# Altium schematic symbol library jlcpcb_2025_04_resistors_extended_2512.schlib: 2667 symbols (part 14 of 14)
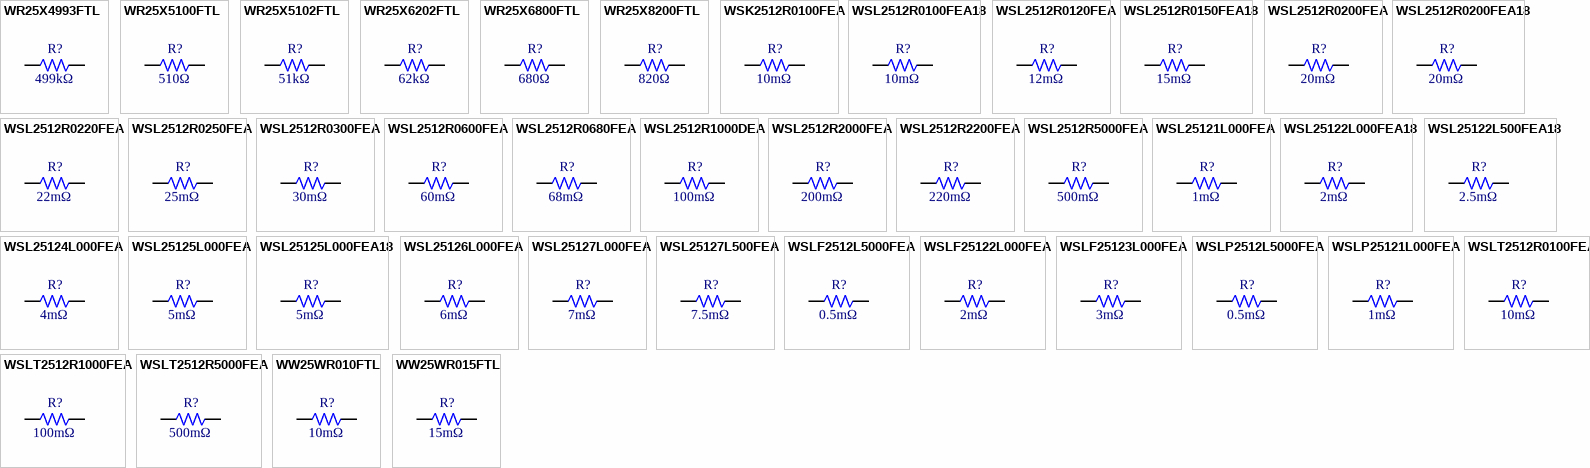
[diagram p79: symbols WR25X4993FTL to WW25WR015FTL]

## WSL2512R0150FEA18
designator R?  Resistance: 15mΩ  (hidden comment: *)
Resistor, 15mΩ, ±1%, 2W, ±75ppm/℃, -65℃~+170℃, SMD 2512; Manufacturer: Uniroyal; Manufacturer Part Number: WSL2512R0150FEA18; Supplier 1: LCSC; Supplier Part Number 1: C844290; JLCPCB Part Number: C844290; Power Rating: 2W; Category: Resistors; Package Size: 2512; JLCPCB Basic Part: Yes; Tolerance: ±1%; Temperature Coefficient: ±75ppm/℃; Temperature Rating: -65℃~+170℃; ComponentLink1Description: Datasheet; ComponentLink1URL: https://wmsc.lcsc.com/wmsc/upload/file/pdf/v2/lcsc/2210190530_Vishay-Intertech-WSL2512R0150FEA18_C844290.pdf; ComponentLink2Description: JLCPCB Part URL; ComponentLink2URL: https://jlcpcb.com/partdetail/C844290
pins: 1, 2
1 alternate drawing of the same symbol

## WSL2512R0200FEA
designator R?  Resistance: 20mΩ  (hidden comment: *)
Resistor, 20mΩ, ±1%, 1W, ±75ppm/℃, -65℃~+170℃, SMD 2512; Manufacturer: Uniroyal; Manufacturer Part Number: WSL2512R0200FEA; Supplier 1: LCSC; Supplier Part Number 1: C553969; JLCPCB Part Number: C553969; Power Rating: 1W; Category: Resistors; Package Size: 2512; JLCPCB Basic Part: Yes; Tolerance: ±1%; Temperature Coefficient: ±75ppm/℃; Temperature Rating: -65℃~+170℃; ComponentLink1Description: Datasheet; ComponentLink1URL: https://wmsc.lcsc.com/wmsc/upload/file/pdf/v2/lcsc/2111241030_Vishay-Intertech-WSL2512R0200FEA_C553969.pdf; ComponentLink2Description: JLCPCB Part URL; ComponentLink2URL: https://jlcpcb.com/partdetail/C553969
pins: 1, 2
1 alternate drawing of the same symbol

## WSL2512R0200FEA18
designator R?  Resistance: 20mΩ  (hidden comment: *)
Resistor, 20mΩ, ±1%, 2W, ±75ppm/℃, -65℃~+170℃, SMD 2512; Manufacturer: Uniroyal; Manufacturer Part Number: WSL2512R0200FEA18; Supplier 1: LCSC; Supplier Part Number 1: C844696; JLCPCB Part Number: C844696; Power Rating: 2W; Category: Resistors; Package Size: 2512; JLCPCB Basic Part: Yes; Tolerance: ±1%; Temperature Coefficient: ±75ppm/℃; Temperature Rating: -65℃~+170℃; ComponentLink1Description: Datasheet; ComponentLink1URL: https://wmsc.lcsc.com/wmsc/upload/file/pdf/v2/lcsc/2312131902_Vishay-Intertech-WSL2512R0200FEA18_C844696.pdf; ComponentLink2Description: JLCPCB Part URL; ComponentLink2URL: https://jlcpcb.com/partdetail/C844696
pins: 1, 2
1 alternate drawing of the same symbol

## WSL2512R0220FEA
designator R?  Resistance: 22mΩ  (hidden comment: *)
Resistor, 22mΩ, ±1%, 1W, ±75ppm/℃, -65℃~+170℃, SMD 2512; Manufacturer: Uniroyal; Manufacturer Part Number: WSL2512R0220FEA; Supplier 1: LCSC; Supplier Part Number 1: C844081; JLCPCB Part Number: C844081; Power Rating: 1W; Category: Resistors; Package Size: 2512; JLCPCB Basic Part: Yes; Tolerance: ±1%; Temperature Coefficient: ±75ppm/℃; Temperature Rating: -65℃~+170℃; ComponentLink1Description: Datasheet; ComponentLink1URL: https://wmsc.lcsc.com/wmsc/upload/file/pdf/v2/lcsc/2206282015_Vishay-Intertech-WSL2512R0220FEA_C844081.pdf; ComponentLink2Description: JLCPCB Part URL; ComponentLink2URL: https://jlcpcb.com/partdetail/C844081
pins: 1, 2
1 alternate drawing of the same symbol

## WSL2512R0250FEA
designator R?  Resistance: 25mΩ  (hidden comment: *)
Resistor, 25mΩ, ±1%, 1W, ±75ppm/℃, -65℃~+170℃, SMD 2512; Manufacturer: Uniroyal; Manufacturer Part Number: WSL2512R0250FEA; Supplier 1: LCSC; Supplier Part Number 1: C844903; JLCPCB Part Number: C844903; Power Rating: 1W; Category: Resistors; Package Size: 2512; JLCPCB Basic Part: Yes; Tolerance: ±1%; Temperature Coefficient: ±75ppm/℃; Temperature Rating: -65℃~+170℃; ComponentLink1Description: Datasheet; ComponentLink1URL: https://wmsc.lcsc.com/wmsc/upload/file/pdf/v2/lcsc/2112021830_Vishay-Intertech-WSL2512R0250FEA_C844903.pdf; ComponentLink2Description: JLCPCB Part URL; ComponentLink2URL: https://jlcpcb.com/partdetail/C844903
pins: 1, 2
1 alternate drawing of the same symbol

## WSL2512R0300FEA
designator R?  Resistance: 30mΩ  (hidden comment: *)
Resistor, 30mΩ, ±1%, 1W, ±75ppm/℃, -65℃~+170℃, SMD 2512; Manufacturer: Uniroyal; Manufacturer Part Number: WSL2512R0300FEA; Supplier 1: LCSC; Supplier Part Number 1: C844697; JLCPCB Part Number: C844697; Power Rating: 1W; Category: Resistors; Package Size: 2512; JLCPCB Basic Part: Yes; Tolerance: ±1%; Temperature Coefficient: ±75ppm/℃; Temperature Rating: -65℃~+170℃; ComponentLink1Description: Datasheet; ComponentLink1URL: https://wmsc.lcsc.com/wmsc/upload/file/pdf/v2/lcsc/2312131902_Vishay-Intertech-WSL2512R0300FEA_C844697.pdf; ComponentLink2Description: JLCPCB Part URL; ComponentLink2URL: https://jlcpcb.com/partdetail/C844697
pins: 1, 2
1 alternate drawing of the same symbol

## WSL2512R0600FEA
designator R?  Resistance: 60mΩ  (hidden comment: *)
Resistor, 60mΩ, ±1%, 1W, ±75ppm/℃, -65℃~+170℃, SMD 2512; Manufacturer: Uniroyal; Manufacturer Part Number: WSL2512R0600FEA; Supplier 1: LCSC; Supplier Part Number 1: C844492; JLCPCB Part Number: C844492; Power Rating: 1W; Category: Resistors; Package Size: 2512; JLCPCB Basic Part: Yes; Tolerance: ±1%; Temperature Coefficient: ±75ppm/℃; Temperature Rating: -65℃~+170℃; ComponentLink1Description: Datasheet; ComponentLink1URL: https://wmsc.lcsc.com/wmsc/upload/file/pdf/v2/lcsc/2206021745_Vishay-Intertech-WSL2512R0600FEA_C844492.pdf; ComponentLink2Description: JLCPCB Part URL; ComponentLink2URL: https://jlcpcb.com/partdetail/C844492
pins: 1, 2
1 alternate drawing of the same symbol

## WSL2512R0680FEA
designator R?  Resistance: 68mΩ  (hidden comment: *)
Resistor, 68mΩ, ±1%, 1W, ±75ppm/℃, -65℃~+170℃, SMD 2512; Manufacturer: Uniroyal; Manufacturer Part Number: WSL2512R0680FEA; Supplier 1: LCSC; Supplier Part Number 1: C4125307; JLCPCB Part Number: C4125307; Power Rating: 1W; Category: Resistors; Package Size: 2512; JLCPCB Basic Part: Yes; Tolerance: ±1%; Temperature Coefficient: ±75ppm/℃; Temperature Rating: -65℃~+170℃; ComponentLink1Description: Datasheet; ComponentLink1URL: https://wmsc.lcsc.com/wmsc/upload/file/pdf/v2/lcsc/2312131019_Vishay-Intertech-WSL2512R0680FEA_C4125307.pdf; ComponentLink2Description: JLCPCB Part URL; ComponentLink2URL: https://jlcpcb.com/partdetail/C4125307
pins: 1, 2
1 alternate drawing of the same symbol

## WSL2512R1000DEA
designator R?  Resistance: 100mΩ  (hidden comment: *)
Resistor, 100mΩ, ±0.5%, 1W, ±75ppm/℃, -65℃~+170℃, SMD 2512; Manufacturer: Uniroyal; Manufacturer Part Number: WSL2512R1000DEA; Supplier 1: LCSC; Supplier Part Number 1: C4322328; JLCPCB Part Number: C4322328; Power Rating: 1W; Category: Resistors; Package Size: 2512; JLCPCB Basic Part: Yes; Tolerance: ±0.5%; Temperature Coefficient: ±75ppm/℃; Temperature Rating: -65℃~+170℃; ComponentLink1Description: Datasheet; ComponentLink1URL: https://wmsc.lcsc.com/wmsc/upload/file/pdf/v2/lcsc/2312181536_Vishay-Intertech-WSL2512R1000DEA_C4322328.pdf; ComponentLink2Description: JLCPCB Part URL; ComponentLink2URL: https://jlcpcb.com/partdetail/C4322328
pins: 1, 2
1 alternate drawing of the same symbol

## WSL2512R2000FEA
designator R?  Resistance: 200mΩ  (hidden comment: *)
Resistor, 200mΩ, ±1%, 1W, ±75ppm/℃, SMD 2512; Manufacturer: Uniroyal; Manufacturer Part Number: WSL2512R2000FEA; Supplier 1: LCSC; Supplier Part Number 1: C844905; JLCPCB Part Number: C844905; Power Rating: 1W; Category: Resistors; Package Size: 2512; JLCPCB Basic Part: Yes; Tolerance: ±1%; Temperature Coefficient: ±75ppm/℃; ComponentLink1Description: Datasheet; ComponentLink1URL: https://wmsc.lcsc.com/wmsc/upload/file/pdf/v2/lcsc/2207211800_Vishay-Intertech-WSL2512R2000FEA_C844905.pdf; ComponentLink2Description: JLCPCB Part URL; ComponentLink2URL: https://jlcpcb.com/partdetail/C844905
pins: 1, 2
1 alternate drawing of the same symbol

## WSL2512R2200FEA
designator R?  Resistance: 220mΩ  (hidden comment: *)
Resistor, 220mΩ, ±1%, 1W, ±75ppm/℃, -65℃~+170℃, SMD 2512; Manufacturer: Uniroyal; Manufacturer Part Number: WSL2512R2200FEA; Supplier 1: LCSC; Supplier Part Number 1: C844292; JLCPCB Part Number: C844292; Power Rating: 1W; Category: Resistors; Package Size: 2512; JLCPCB Basic Part: Yes; Tolerance: ±1%; Temperature Coefficient: ±75ppm/℃; Temperature Rating: -65℃~+170℃; ComponentLink1Description: Datasheet; ComponentLink1URL: https://wmsc.lcsc.com/wmsc/upload/file/pdf/v2/lcsc/2206282015_Vishay-Intertech-WSL2512R2200FEA_C844292.pdf; ComponentLink2Description: JLCPCB Part URL; ComponentLink2URL: https://jlcpcb.com/partdetail/C844292
pins: 1, 2
1 alternate drawing of the same symbol

## WSL2512R5000FEA
designator R?  Resistance: 500mΩ  (hidden comment: *)
Resistor, 500mΩ, ±1%, 1W, ±75ppm/℃, -65℃~+170℃, SMD 2512; Manufacturer: Uniroyal; Manufacturer Part Number: WSL2512R5000FEA; Supplier 1: LCSC; Supplier Part Number 1: C511023; JLCPCB Part Number: C511023; Power Rating: 1W; Category: Resistors; Package Size: 2512; JLCPCB Basic Part: Yes; Tolerance: ±1%; Temperature Coefficient: ±75ppm/℃; Temperature Rating: -65℃~+170℃; ComponentLink1Description: Datasheet; ComponentLink1URL: https://wmsc.lcsc.com/wmsc/upload/file/pdf/v2/lcsc/2009221615_Vishay-Intertech-WSL2512R5000FEA_C511023.pdf; ComponentLink2Description: JLCPCB Part URL; ComponentLink2URL: https://jlcpcb.com/partdetail/C511023
pins: 1, 2
1 alternate drawing of the same symbol

## WSL25121L000FEA
designator R?  Resistance: 1mΩ  (hidden comment: *)
Resistor, 1mΩ, ±1%, 1W, ±275ppm/℃, -65℃~+170℃, SMD 2512; Manufacturer: Uniroyal; Manufacturer Part Number: WSL25121L000FEA; Supplier 1: LCSC; Supplier Part Number 1: C844690; JLCPCB Part Number: C844690; Power Rating: 1W; Category: Resistors; Package Size: 2512; JLCPCB Basic Part: Yes; Tolerance: ±1%; Temperature Coefficient: ±275ppm/℃; Temperature Rating: -65℃~+170℃; ComponentLink1Description: Datasheet; ComponentLink1URL: https://wmsc.lcsc.com/wmsc/upload/file/pdf/v2/lcsc/2312131902_Vishay-Intertech-WSL25121L000FEA_C844690.pdf; ComponentLink2Description: JLCPCB Part URL; ComponentLink2URL: https://jlcpcb.com/partdetail/C844690
pins: 1, 2
1 alternate drawing of the same symbol

## WSL25122L000FEA18
designator R?  Resistance: 2mΩ  (hidden comment: *)
Resistor, 2mΩ, ±1%, 2W, ±275ppm/℃, -65℃~+170℃, SMD 2512; Manufacturer: Uniroyal; Manufacturer Part Number: WSL25122L000FEA18; Supplier 1: LCSC; Supplier Part Number 1: C844691; JLCPCB Part Number: C844691; Power Rating: 2W; Category: Resistors; Package Size: 2512; JLCPCB Basic Part: Yes; Tolerance: ±1%; Temperature Coefficient: ±275ppm/℃; Temperature Rating: -65℃~+170℃; ComponentLink1Description: Datasheet; ComponentLink1URL: https://wmsc.lcsc.com/wmsc/upload/file/pdf/v2/lcsc/2312131902_Vishay-Intertech-WSL25122L000FEA18_C844691.pdf; ComponentLink2Description: JLCPCB Part URL; ComponentLink2URL: https://jlcpcb.com/partdetail/C844691
pins: 1, 2
1 alternate drawing of the same symbol

## WSL25122L500FEA18
designator R?  Resistance: 2.5mΩ  (hidden comment: *)
Resistor, 2.5mΩ, ±1%, 2W, ±275ppm/℃, -65℃~+170℃, SMD 2512; Manufacturer: Uniroyal; Manufacturer Part Number: WSL25122L500FEA18; Supplier 1: LCSC; Supplier Part Number 1: C4173086; JLCPCB Part Number: C4173086; Power Rating: 2W; Category: Resistors; Package Size: 2512; JLCPCB Basic Part: Yes; Tolerance: ±1%; Temperature Coefficient: ±275ppm/℃; Temperature Rating: -65℃~+170℃; ComponentLink1Description: Datasheet; ComponentLink1URL: https://wmsc.lcsc.com/wmsc/upload/file/pdf/v2/lcsc/2312131041_Vishay-Intertech-WSL25122L500FEA18_C4173086.pdf; ComponentLink2Description: JLCPCB Part URL; ComponentLink2URL: https://jlcpcb.com/partdetail/C4173086
pins: 1, 2
1 alternate drawing of the same symbol

## WSL25124L000FEA
designator R?  Resistance: 4mΩ  (hidden comment: *)
Resistor, 4mΩ, ±1%, 1W, ±150ppm/℃, -65℃~+170℃, SMD 2512; Manufacturer: Uniroyal; Manufacturer Part Number: WSL25124L000FEA; Supplier 1: LCSC; Supplier Part Number 1: C844693; JLCPCB Part Number: C844693; Power Rating: 1W; Category: Resistors; Package Size: 2512; JLCPCB Basic Part: Yes; Tolerance: ±1%; Temperature Coefficient: ±150ppm/℃; Temperature Rating: -65℃~+170℃; ComponentLink1Description: Datasheet; ComponentLink1URL: https://wmsc.lcsc.com/wmsc/upload/file/pdf/v2/lcsc/2201051730_Vishay-Intertech-WSL25124L000FEA_C844693.pdf; ComponentLink2Description: JLCPCB Part URL; ComponentLink2URL: https://jlcpcb.com/partdetail/C844693
pins: 1, 2
1 alternate drawing of the same symbol

## WSL25125L000FEA
designator R?  Resistance: 5mΩ  (hidden comment: *)
Resistor, 5mΩ, ±1%, 1W, ±110ppm/℃, -65℃~+170℃, SMD 2512; Manufacturer: Uniroyal; Manufacturer Part Number: WSL25125L000FEA; Supplier 1: LCSC; Supplier Part Number 1: C844900; JLCPCB Part Number: C844900; Power Rating: 1W; Category: Resistors; Package Size: 2512; JLCPCB Basic Part: Yes; Tolerance: ±1%; Temperature Coefficient: ±110ppm/℃; Temperature Rating: -65℃~+170℃; ComponentLink1Description: Datasheet; ComponentLink1URL: https://wmsc.lcsc.com/wmsc/upload/file/pdf/v2/lcsc/2112021830_Vishay-Intertech-WSL25125L000FEA_C844900.pdf; ComponentLink2Description: JLCPCB Part URL; ComponentLink2URL: https://jlcpcb.com/partdetail/C844900
pins: 1, 2
1 alternate drawing of the same symbol

## WSL25125L000FEA18
designator R?  Resistance: 5mΩ  (hidden comment: *)
Resistor, 5mΩ, ±1%, 2W, ±110ppm/℃, -65℃~+170℃, SMD 2512; Manufacturer: Uniroyal; Manufacturer Part Number: WSL25125L000FEA18; Supplier 1: LCSC; Supplier Part Number 1: C844694; JLCPCB Part Number: C844694; Power Rating: 2W; Category: Resistors; Package Size: 2512; JLCPCB Basic Part: Yes; Tolerance: ±1%; Temperature Coefficient: ±110ppm/℃; Temperature Rating: -65℃~+170℃; ComponentLink1Description: Datasheet; ComponentLink1URL: https://wmsc.lcsc.com/wmsc/upload/file/pdf/v2/lcsc/2312131902_Vishay-Intertech-WSL25125L000FEA18_C844694.pdf; ComponentLink2Description: JLCPCB Part URL; ComponentLink2URL: https://jlcpcb.com/partdetail/C844694
pins: 1, 2
1 alternate drawing of the same symbol

## WSL25126L000FEA
designator R?  Resistance: 6mΩ  (hidden comment: *)
Resistor, 6mΩ, ±1%, 1W, ±110ppm/℃, -65℃~+170℃, SMD 2512; Manufacturer: Uniroyal; Manufacturer Part Number: WSL25126L000FEA; Supplier 1: LCSC; Supplier Part Number 1: C843882; JLCPCB Part Number: C843882; Power Rating: 1W; Category: Resistors; Package Size: 2512; JLCPCB Basic Part: Yes; Tolerance: ±1%; Temperature Coefficient: ±110ppm/℃; Temperature Rating: -65℃~+170℃; ComponentLink1Description: Datasheet; ComponentLink1URL: https://wmsc.lcsc.com/wmsc/upload/file/pdf/v2/lcsc/2201051730_Vishay-Intertech-WSL25126L000FEA_C843882.pdf; ComponentLink2Description: JLCPCB Part URL; ComponentLink2URL: https://jlcpcb.com/partdetail/C843882
pins: 1, 2
1 alternate drawing of the same symbol

## WSL25127L000FEA
designator R?  Resistance: 7mΩ  (hidden comment: *)
Resistor, 7mΩ, ±1%, 1W, ±75ppm/℃, -65℃~+170℃, SMD 2512; Manufacturer: Uniroyal; Manufacturer Part Number: WSL25127L000FEA; Supplier 1: LCSC; Supplier Part Number 1: C511006; JLCPCB Part Number: C511006; Power Rating: 1W; Category: Resistors; Package Size: 2512; JLCPCB Basic Part: Yes; Tolerance: ±1%; Temperature Coefficient: ±75ppm/℃; Temperature Rating: -65℃~+170℃; ComponentLink1Description: Datasheet; ComponentLink1URL: https://wmsc.lcsc.com/wmsc/upload/file/pdf/v2/lcsc/2312131229_Vishay-Intertech-WSL25127L000FEA_C511006.pdf; ComponentLink2Description: JLCPCB Part URL; ComponentLink2URL: https://jlcpcb.com/partdetail/C511006
pins: 1, 2
1 alternate drawing of the same symbol

## WSL25127L500FEA
designator R?  Resistance: 7.5mΩ  (hidden comment: *)
Resistor, 7.5mΩ, ±1%, 1W, ±75ppm/℃, -65℃~+170℃, SMD 2512; Manufacturer: Uniroyal; Manufacturer Part Number: WSL25127L500FEA; Supplier 1: LCSC; Supplier Part Number 1: C4166504; JLCPCB Part Number: C4166504; Power Rating: 1W; Category: Resistors; Package Size: 2512; JLCPCB Basic Part: Yes; Tolerance: ±1%; Temperature Coefficient: ±75ppm/℃; Temperature Rating: -65℃~+170℃; ComponentLink1Description: Datasheet; ComponentLink1URL: https://wmsc.lcsc.com/wmsc/upload/file/pdf/v2/lcsc/2312131038_Vishay-Intertech-WSL25127L500FEA_C4166504.pdf; ComponentLink2Description: JLCPCB Part URL; ComponentLink2URL: https://jlcpcb.com/partdetail/C4166504
pins: 1, 2
1 alternate drawing of the same symbol

## WSLF2512L5000FEA
designator R?  Resistance: 0.5mΩ  (hidden comment: *)
Resistor, 0.5mΩ, ±1%, 6W, ±200ppm/℃, -65℃~+170℃, SMD 2512; Manufacturer: Uniroyal; Manufacturer Part Number: WSLF2512L5000FEA; Supplier 1: LCSC; Supplier Part Number 1: C844703; JLCPCB Part Number: C844703; Power Rating: 6W; Category: Resistors; Package Size: 2512; JLCPCB Basic Part: Yes; Tolerance: ±1%; Temperature Coefficient: ±200ppm/℃; Temperature Rating: -65℃~+170℃; ComponentLink1Description: Datasheet; ComponentLink1URL: https://wmsc.lcsc.com/wmsc/upload/file/pdf/v2/lcsc/2312131902_Vishay-Intertech-WSLF2512L5000FEA_C844703.pdf; ComponentLink2Description: JLCPCB Part URL; ComponentLink2URL: https://jlcpcb.com/partdetail/C844703
pins: 1, 2
1 alternate drawing of the same symbol

## WSLF25122L000FEA
designator R?  Resistance: 2mΩ  (hidden comment: *)
Resistor, 2mΩ, ±1%, 5W, ±70ppm/℃, -65℃~+170℃, SMD 2512; Manufacturer: Uniroyal; Manufacturer Part Number: WSLF25122L000FEA; Supplier 1: LCSC; Supplier Part Number 1: C844701; JLCPCB Part Number: C844701; Power Rating: 5W; Category: Resistors; Package Size: 2512; JLCPCB Basic Part: Yes; Tolerance: ±1%; Temperature Coefficient: ±70ppm/℃; Temperature Rating: -65℃~+170℃; ComponentLink1Description: Datasheet; ComponentLink1URL: https://wmsc.lcsc.com/wmsc/upload/file/pdf/v2/lcsc/2312131902_Vishay-Intertech-WSLF25122L000FEA_C844701.pdf; ComponentLink2Description: JLCPCB Part URL; ComponentLink2URL: https://jlcpcb.com/partdetail/C844701
pins: 1, 2
1 alternate drawing of the same symbol

## WSLF25123L000FEA
designator R?  Resistance: 3mΩ  (hidden comment: *)
Resistor, 3mΩ, ±1%, 4W, ±70ppm/℃, -65℃~+170℃, SMD 2512; Manufacturer: Uniroyal; Manufacturer Part Number: WSLF25123L000FEA; Supplier 1: LCSC; Supplier Part Number 1: C844702; JLCPCB Part Number: C844702; Power Rating: 4W; Category: Resistors; Package Size: 2512; JLCPCB Basic Part: Yes; Tolerance: ±1%; Temperature Coefficient: ±70ppm/℃; Temperature Rating: -65℃~+170℃; ComponentLink1Description: Datasheet; ComponentLink1URL: https://wmsc.lcsc.com/wmsc/upload/file/pdf/v2/lcsc/2312131902_Vishay-Intertech-WSLF25123L000FEA_C844702.pdf; ComponentLink2Description: JLCPCB Part URL; ComponentLink2URL: https://jlcpcb.com/partdetail/C844702
pins: 1, 2
1 alternate drawing of the same symbol

## WSLP2512L5000FEA
designator R?  Resistance: 0.5mΩ  (hidden comment: *)
Resistor, 0.5mΩ, ±1%, 3W, ±75ppm/℃, -65℃~+170℃, SMD 2512; Manufacturer: Uniroyal; Manufacturer Part Number: WSLP2512L5000FEA; Supplier 1: LCSC; Supplier Part Number 1: C844296; JLCPCB Part Number: C844296; Power Rating: 3W; Category: Resistors; Package Size: 2512; JLCPCB Basic Part: Yes; Tolerance: ±1%; Temperature Coefficient: ±75ppm/℃; Temperature Rating: -65℃~+170℃; ComponentLink1Description: Datasheet; ComponentLink1URL: https://wmsc.lcsc.com/wmsc/upload/file/pdf/v2/lcsc/2210190530_Vishay-Intertech-WSLP2512L5000FEA_C844296.pdf; ComponentLink2Description: JLCPCB Part URL; ComponentLink2URL: https://jlcpcb.com/partdetail/C844296
pins: 1, 2
1 alternate drawing of the same symbol

## WSLP25121L000FEA
designator R?  Resistance: 1mΩ  (hidden comment: *)
Resistor, 1mΩ, ±1%, 3W, ±275ppm/℃, -65℃~+170℃, SMD 2512; Manufacturer: Uniroyal; Manufacturer Part Number: WSLP25121L000FEA; Supplier 1: LCSC; Supplier Part Number 1: C844705; JLCPCB Part Number: C844705; Power Rating: 3W; Category: Resistors; Package Size: 2512; JLCPCB Basic Part: Yes; Tolerance: ±1%; Temperature Coefficient: ±275ppm/℃; Temperature Rating: -65℃~+170℃; ComponentLink1Description: Datasheet; ComponentLink1URL: https://wmsc.lcsc.com/wmsc/upload/file/pdf/v2/lcsc/2312131902_Vishay-Intertech-WSLP25121L000FEA_C844705.pdf; ComponentLink2Description: JLCPCB Part URL; ComponentLink2URL: https://jlcpcb.com/partdetail/C844705
pins: 1, 2
1 alternate drawing of the same symbol

## WSLT2512R0100FEA
designator R?  Resistance: 10mΩ  (hidden comment: *)
Resistor, 10mΩ, ±1%, 1W, ±75ppm/℃, -65℃~+275℃, SMD 2512; Manufacturer: Uniroyal; Manufacturer Part Number: WSLT2512R0100FEA; Supplier 1: LCSC; Supplier Part Number 1: C844499; JLCPCB Part Number: C844499; Power Rating: 1W; Category: Resistors; Package Size: 2512; JLCPCB Basic Part: Yes; Tolerance: ±1%; Temperature Coefficient: ±75ppm/℃; Temperature Rating: -65℃~+275℃; ComponentLink1Description: Datasheet; ComponentLink1URL: https://wmsc.lcsc.com/wmsc/upload/file/pdf/v2/lcsc/2312131902_Vishay-Intertech-WSLT2512R0100FEA_C844499.pdf; ComponentLink2Description: JLCPCB Part URL; ComponentLink2URL: https://jlcpcb.com/partdetail/C844499
pins: 1, 2
1 alternate drawing of the same symbol

## WSLT2512R1000FEA
designator R?  Resistance: 100mΩ  (hidden comment: *)
Resistor, 100mΩ, ±1%, 1W, ±75ppm/℃, -65℃~+275℃, SMD 2512; Manufacturer: Uniroyal; Manufacturer Part Number: WSLT2512R1000FEA; Supplier 1: LCSC; Supplier Part Number 1: C4240903; JLCPCB Part Number: C4240903; Power Rating: 1W; Category: Resistors; Package Size: 2512; JLCPCB Basic Part: Yes; Tolerance: ±1%; Temperature Coefficient: ±75ppm/℃; Temperature Rating: -65℃~+275℃; ComponentLink1Description: Datasheet; ComponentLink1URL: https://wmsc.lcsc.com/wmsc/upload/file/pdf/v2/lcsc/2312131114_Vishay-Intertech-WSLT2512R1000FEA_C4240903.pdf; ComponentLink2Description: JLCPCB Part URL; ComponentLink2URL: https://jlcpcb.com/partdetail/C4240903
pins: 1, 2
1 alternate drawing of the same symbol

## WSLT2512R5000FEA
designator R?  Resistance: 500mΩ  (hidden comment: *)
Resistor, 500mΩ, ±1%, 1W, ±75ppm/℃, -65℃~+275℃, SMD 2512; Manufacturer: Uniroyal; Manufacturer Part Number: WSLT2512R5000FEA; Supplier 1: LCSC; Supplier Part Number 1: C844299; JLCPCB Part Number: C844299; Power Rating: 1W; Category: Resistors; Package Size: 2512; JLCPCB Basic Part: Yes; Tolerance: ±1%; Temperature Coefficient: ±75ppm/℃; Temperature Rating: -65℃~+275℃; ComponentLink1Description: Datasheet; ComponentLink1URL: https://wmsc.lcsc.com/wmsc/upload/file/pdf/v2/lcsc/2210190530_Vishay-Intertech-WSLT2512R5000FEA_C844299.pdf; ComponentLink2Description: JLCPCB Part URL; ComponentLink2URL: https://jlcpcb.com/partdetail/C844299
pins: 1, 2
1 alternate drawing of the same symbol

## WW25WR010FTL
designator R?  Resistance: 10mΩ  (hidden comment: *)
Resistor, 10mΩ, ±1%, 1W, ±1000ppm/℃, -55℃~+155℃, SMD 2512; Manufacturer: Uniroyal; Manufacturer Part Number: WW25WR010FTL; Supplier 1: LCSC; Supplier Part Number 1: C171418; JLCPCB Part Number: C171418; Power Rating: 1W; Category: Resistors; Package Size: 2512; JLCPCB Basic Part: Yes; Tolerance: ±1%; Temperature Coefficient: ±1000ppm/℃; Temperature Rating: -55℃~+155℃; ComponentLink1Description: Datasheet; ComponentLink1URL: https://wmsc.lcsc.com/wmsc/upload/file/pdf/v2/lcsc/2304140030_Walsin-Tech-Corp-WW25WR010FTL_C171418.pdf; ComponentLink2Description: JLCPCB Part URL; ComponentLink2URL: https://jlcpcb.com/partdetail/C171418
pins: 1, 2
1 alternate drawing of the same symbol

## WW25WR015FTL
designator R?  Resistance: 15mΩ  (hidden comment: *)
Resistor, 15mΩ, ±1%, 1W, ±1000ppm/℃, -55℃~+155℃, SMD 2512; Manufacturer: Uniroyal; Manufacturer Part Number: WW25WR015FTL; Supplier 1: LCSC; Supplier Part Number 1: C172337; JLCPCB Part Number: C172337; Power Rating: 1W; Category: Resistors; Package Size: 2512; JLCPCB Basic Part: Yes; Tolerance: ±1%; Temperature Coefficient: ±1000ppm/℃; Temperature Rating: -55℃~+155℃; ComponentLink1Description: Datasheet; ComponentLink1URL: https://wmsc.lcsc.com/wmsc/upload/file/pdf/v2/lcsc/2304140030_Walsin-Tech-Corp-WW25WR015FTL_C172337.pdf; ComponentLink2Description: JLCPCB Part URL; ComponentLink2URL: https://jlcpcb.com/partdetail/C172337
pins: 1, 2
1 alternate drawing of the same symbol

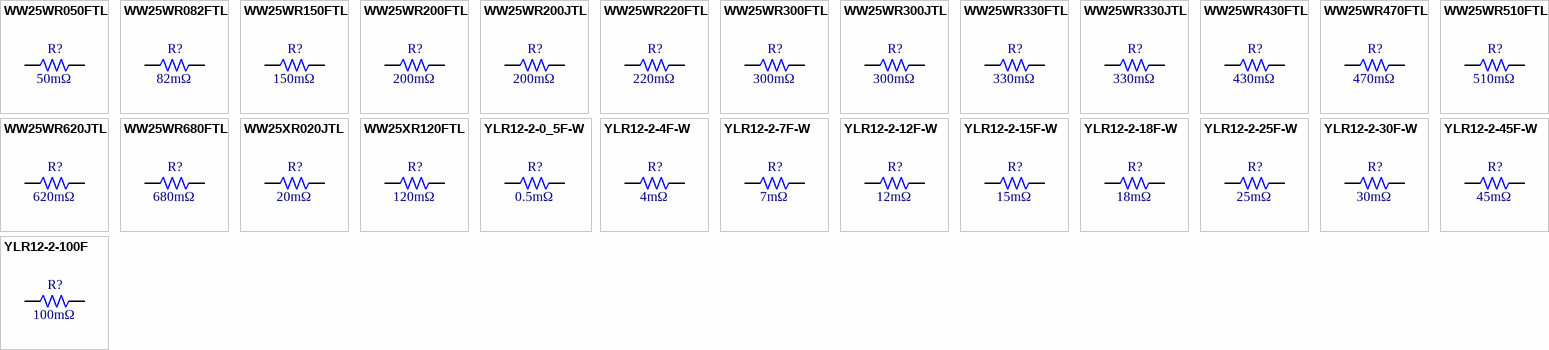
[diagram p66: symbols WW25WR050FTL to YLR12-2-100F]

## WW25WR050FTL
designator R?  Resistance: 50mΩ  (hidden comment: *)
Resistor, 50mΩ, ±1%, 1W, ±100ppm/℃, -55℃~+155℃, SMD 2512; Manufacturer: Uniroyal; Manufacturer Part Number: WW25WR050FTL; Supplier 1: LCSC; Supplier Part Number 1: C168610; JLCPCB Part Number: C168610; Power Rating: 1W; Category: Resistors; Package Size: 2512; JLCPCB Basic Part: Yes; Tolerance: ±1%; Temperature Coefficient: ±100ppm/℃; Temperature Rating: -55℃~+155℃; ComponentLink1Description: Datasheet; ComponentLink1URL: https://wmsc.lcsc.com/wmsc/upload/file/pdf/v2/lcsc/2304140030_Walsin-Tech-Corp-WW25WR050FTL_C168610.pdf; ComponentLink2Description: JLCPCB Part URL; ComponentLink2URL: https://jlcpcb.com/partdetail/C168610
pins: 1, 2
1 alternate drawing of the same symbol

## WW25WR082FTL
designator R?  Resistance: 82mΩ  (hidden comment: *)
Resistor, 82mΩ, ±1%, 1W, ±100ppm/℃, -55℃~+155℃, SMD 2512; Manufacturer: Uniroyal; Manufacturer Part Number: WW25WR082FTL; Supplier 1: LCSC; Supplier Part Number 1: C383876; JLCPCB Part Number: C383876; Power Rating: 1W; Category: Resistors; Package Size: 2512; JLCPCB Basic Part: Yes; Tolerance: ±1%; Temperature Coefficient: ±100ppm/℃; Temperature Rating: -55℃~+155℃; ComponentLink1Description: Datasheet; ComponentLink1URL: https://wmsc.lcsc.com/wmsc/upload/file/pdf/v2/lcsc/2304140030_Walsin-Tech-Corp-WW25WR082FTL_C383876.pdf; ComponentLink2Description: JLCPCB Part URL; ComponentLink2URL: https://jlcpcb.com/partdetail/C383876
pins: 1, 2
1 alternate drawing of the same symbol

## WW25WR150FTL
designator R?  Resistance: 150mΩ  (hidden comment: *)
Resistor, 150mΩ, ±1%, 1W, ±100ppm/℃, -55℃~+155℃, SMD 2512; Manufacturer: Uniroyal; Manufacturer Part Number: WW25WR150FTL; Supplier 1: LCSC; Supplier Part Number 1: C383875; JLCPCB Part Number: C383875; Power Rating: 1W; Category: Resistors; Package Size: 2512; JLCPCB Basic Part: Yes; Tolerance: ±1%; Temperature Coefficient: ±100ppm/℃; Temperature Rating: -55℃~+155℃; ComponentLink1Description: Datasheet; ComponentLink1URL: https://wmsc.lcsc.com/wmsc/upload/file/pdf/v2/lcsc/2304140030_Walsin-Tech-Corp-WW25WR150FTL_C383875.pdf; ComponentLink2Description: JLCPCB Part URL; ComponentLink2URL: https://jlcpcb.com/partdetail/C383875
pins: 1, 2
1 alternate drawing of the same symbol

## WW25WR200FTL
designator R?  Resistance: 200mΩ  (hidden comment: *)
Resistor, 200mΩ, ±1%, 1W, ±100ppm/℃, -55℃~+155℃, SMD 2512; Manufacturer: Uniroyal; Manufacturer Part Number: WW25WR200FTL; Supplier 1: LCSC; Supplier Part Number 1: C470051; JLCPCB Part Number: C470051; Power Rating: 1W; Category: Resistors; Package Size: 2512; JLCPCB Basic Part: Yes; Tolerance: ±1%; Temperature Coefficient: ±100ppm/℃; Temperature Rating: -55℃~+155℃; ComponentLink1Description: Datasheet; ComponentLink1URL: https://wmsc.lcsc.com/wmsc/upload/file/pdf/v2/lcsc/2304140030_Walsin-Tech-Corp-WW25WR200FTL_C470051.pdf; ComponentLink2Description: JLCPCB Part URL; ComponentLink2URL: https://jlcpcb.com/partdetail/C470051
pins: 1, 2
1 alternate drawing of the same symbol

## WW25WR200JTL
designator R?  Resistance: 200mΩ  (hidden comment: *)
Resistor, 200mΩ, ±5%, 1W, ±100ppm/℃, -55℃~+155℃, SMD 2512; Manufacturer: Uniroyal; Manufacturer Part Number: WW25WR200JTL; Supplier 1: LCSC; Supplier Part Number 1: C171424; JLCPCB Part Number: C171424; Power Rating: 1W; Category: Resistors; Package Size: 2512; JLCPCB Basic Part: Yes; Tolerance: ±5%; Temperature Coefficient: ±100ppm/℃; Temperature Rating: -55℃~+155℃; ComponentLink1Description: Datasheet; ComponentLink1URL: https://wmsc.lcsc.com/wmsc/upload/file/pdf/v2/lcsc/2304140030_Walsin-Tech-Corp-WW25WR200JTL_C171424.pdf; ComponentLink2Description: JLCPCB Part URL; ComponentLink2URL: https://jlcpcb.com/partdetail/C171424
pins: 1, 2
1 alternate drawing of the same symbol

## WW25WR220FTL
designator R?  Resistance: 220mΩ  (hidden comment: *)
Resistor, 220mΩ, ±1%, 1W, ±100ppm/℃, -55℃~+155℃, SMD 2512; Manufacturer: Uniroyal; Manufacturer Part Number: WW25WR220FTL; Supplier 1: LCSC; Supplier Part Number 1: C470052; JLCPCB Part Number: C470052; Power Rating: 1W; Category: Resistors; Package Size: 2512; JLCPCB Basic Part: Yes; Tolerance: ±1%; Temperature Coefficient: ±100ppm/℃; Temperature Rating: -55℃~+155℃; ComponentLink1Description: Datasheet; ComponentLink1URL: https://wmsc.lcsc.com/wmsc/upload/file/pdf/v2/lcsc/2304140030_Walsin-Tech-Corp-WW25WR220FTL_C470052.pdf; ComponentLink2Description: JLCPCB Part URL; ComponentLink2URL: https://jlcpcb.com/partdetail/C470052
pins: 1, 2
1 alternate drawing of the same symbol

## WW25WR300FTL
designator R?  Resistance: 300mΩ  (hidden comment: *)
Resistor, 300mΩ, ±1%, 1W, ±100ppm/℃, -55℃~+155℃, SMD 2512; Manufacturer: Uniroyal; Manufacturer Part Number: WW25WR300FTL; Supplier 1: LCSC; Supplier Part Number 1: C171420; JLCPCB Part Number: C171420; Power Rating: 1W; Category: Resistors; Package Size: 2512; JLCPCB Basic Part: Yes; Tolerance: ±1%; Temperature Coefficient: ±100ppm/℃; Temperature Rating: -55℃~+155℃; ComponentLink1Description: Datasheet; ComponentLink1URL: https://wmsc.lcsc.com/wmsc/upload/file/pdf/v2/lcsc/2304140030_Walsin-Tech-Corp-WW25WR300FTL_C171420.pdf; ComponentLink2Description: JLCPCB Part URL; ComponentLink2URL: https://jlcpcb.com/partdetail/C171420
pins: 1, 2
1 alternate drawing of the same symbol

## WW25WR300JTL
designator R?  Resistance: 300mΩ  (hidden comment: *)
Resistor, 300mΩ, ±5%, 1W, ±100ppm/℃, -55℃~+155℃, SMD 2512; Manufacturer: Uniroyal; Manufacturer Part Number: WW25WR300JTL; Supplier 1: LCSC; Supplier Part Number 1: C172339; JLCPCB Part Number: C172339; Power Rating: 1W; Category: Resistors; Package Size: 2512; JLCPCB Basic Part: Yes; Tolerance: ±5%; Temperature Coefficient: ±100ppm/℃; Temperature Rating: -55℃~+155℃; ComponentLink1Description: Datasheet; ComponentLink1URL: https://wmsc.lcsc.com/wmsc/upload/file/pdf/v2/lcsc/2202141730_Walsin-Tech-Corp-WW25WR300JTL_C172339.pdf; ComponentLink2Description: JLCPCB Part URL; ComponentLink2URL: https://jlcpcb.com/partdetail/C172339
pins: 1, 2
1 alternate drawing of the same symbol

## WW25WR330FTL
designator R?  Resistance: 330mΩ  (hidden comment: *)
Resistor, 330mΩ, ±1%, 1W, ±100ppm/℃, -55℃~+155℃, SMD 2512; Manufacturer: Uniroyal; Manufacturer Part Number: WW25WR330FTL; Supplier 1: LCSC; Supplier Part Number 1: C383874; JLCPCB Part Number: C383874; Power Rating: 1W; Category: Resistors; Package Size: 2512; JLCPCB Basic Part: Yes; Tolerance: ±1%; Temperature Coefficient: ±100ppm/℃; Temperature Rating: -55℃~+155℃; ComponentLink1Description: Datasheet; ComponentLink1URL: https://wmsc.lcsc.com/wmsc/upload/file/pdf/v2/lcsc/2304140030_Walsin-Tech-Corp-WW25WR330FTL_C383874.pdf; ComponentLink2Description: JLCPCB Part URL; ComponentLink2URL: https://jlcpcb.com/partdetail/C383874
pins: 1, 2
1 alternate drawing of the same symbol

## WW25WR330JTL
designator R?  Resistance: 330mΩ  (hidden comment: *)
Resistor, 330mΩ, ±5%, 1W, ±100ppm/℃, -55℃~+155℃, SMD 2512; Manufacturer: Uniroyal; Manufacturer Part Number: WW25WR330JTL; Supplier 1: LCSC; Supplier Part Number 1: C171425; JLCPCB Part Number: C171425; Power Rating: 1W; Category: Resistors; Package Size: 2512; JLCPCB Basic Part: Yes; Tolerance: ±5%; Temperature Coefficient: ±100ppm/℃; Temperature Rating: -55℃~+155℃; ComponentLink1Description: Datasheet; ComponentLink1URL: https://wmsc.lcsc.com/wmsc/upload/file/pdf/v2/lcsc/2304140030_Walsin-Tech-Corp-WW25WR330JTL_C171425.pdf; ComponentLink2Description: JLCPCB Part URL; ComponentLink2URL: https://jlcpcb.com/partdetail/C171425
pins: 1, 2
1 alternate drawing of the same symbol

## WW25WR430FTL
designator R?  Resistance: 430mΩ  (hidden comment: *)
Resistor, 430mΩ, ±1%, 1W, ±100ppm/℃, -55℃~+155℃, SMD 2512; Manufacturer: Uniroyal; Manufacturer Part Number: WW25WR430FTL; Supplier 1: LCSC; Supplier Part Number 1: C171421; JLCPCB Part Number: C171421; Power Rating: 1W; Category: Resistors; Package Size: 2512; JLCPCB Basic Part: Yes; Tolerance: ±1%; Temperature Coefficient: ±100ppm/℃; Temperature Rating: -55℃~+155℃; ComponentLink1Description: Datasheet; ComponentLink1URL: https://wmsc.lcsc.com/wmsc/upload/file/pdf/v2/lcsc/2304140030_Walsin-Tech-Corp-WW25WR430FTL_C171421.pdf; ComponentLink2Description: JLCPCB Part URL; ComponentLink2URL: https://jlcpcb.com/partdetail/C171421
pins: 1, 2
1 alternate drawing of the same symbol

## WW25WR470FTL
designator R?  Resistance: 470mΩ  (hidden comment: *)
Resistor, 470mΩ, ±1%, 1W, ±100ppm/℃, -55℃~+155℃, SMD 2512; Manufacturer: Uniroyal; Manufacturer Part Number: WW25WR470FTL; Supplier 1: LCSC; Supplier Part Number 1: C383873; JLCPCB Part Number: C383873; Power Rating: 1W; Category: Resistors; Package Size: 2512; JLCPCB Basic Part: Yes; Tolerance: ±1%; Temperature Coefficient: ±100ppm/℃; Temperature Rating: -55℃~+155℃; ComponentLink1Description: Datasheet; ComponentLink1URL: https://wmsc.lcsc.com/wmsc/upload/file/pdf/v2/lcsc/2304140030_Walsin-Tech-Corp-WW25WR470FTL_C383873.pdf; ComponentLink2Description: JLCPCB Part URL; ComponentLink2URL: https://jlcpcb.com/partdetail/C383873
pins: 1, 2
1 alternate drawing of the same symbol

## WW25WR510FTL
designator R?  Resistance: 510mΩ  (hidden comment: *)
Resistor, 510mΩ, ±1%, 1W, ±100ppm/℃, -55℃~+155℃, SMD 2512; Manufacturer: Uniroyal; Manufacturer Part Number: WW25WR510FTL; Supplier 1: LCSC; Supplier Part Number 1: C383872; JLCPCB Part Number: C383872; Power Rating: 1W; Category: Resistors; Package Size: 2512; JLCPCB Basic Part: Yes; Tolerance: ±1%; Temperature Coefficient: ±100ppm/℃; Temperature Rating: -55℃~+155℃; ComponentLink1Description: Datasheet; ComponentLink1URL: https://wmsc.lcsc.com/wmsc/upload/file/pdf/v2/lcsc/2304140030_Walsin-Tech-Corp-WW25WR510FTL_C383872.pdf; ComponentLink2Description: JLCPCB Part URL; ComponentLink2URL: https://jlcpcb.com/partdetail/C383872
pins: 1, 2
1 alternate drawing of the same symbol

## WW25WR620JTL
designator R?  Resistance: 620mΩ  (hidden comment: *)
Resistor, 620mΩ, ±5%, 1W, ±100ppm/℃, -55℃~+155℃, SMD 2512; Manufacturer: Uniroyal; Manufacturer Part Number: WW25WR620JTL; Supplier 1: LCSC; Supplier Part Number 1: C172340; JLCPCB Part Number: C172340; Power Rating: 1W; Category: Resistors; Package Size: 2512; JLCPCB Basic Part: Yes; Tolerance: ±5%; Temperature Coefficient: ±100ppm/℃; Temperature Rating: -55℃~+155℃; ComponentLink1Description: Datasheet; ComponentLink1URL: https://wmsc.lcsc.com/wmsc/upload/file/pdf/v2/lcsc/2304140030_Walsin-Tech-Corp-WW25WR620JTL_C172340.pdf; ComponentLink2Description: JLCPCB Part URL; ComponentLink2URL: https://jlcpcb.com/partdetail/C172340
pins: 1, 2
1 alternate drawing of the same symbol

## WW25WR680FTL
designator R?  Resistance: 680mΩ  (hidden comment: *)
Resistor, 680mΩ, ±1%, 1W, ±100ppm/℃, -55℃~+155℃, SMD 2512; Manufacturer: Uniroyal; Manufacturer Part Number: WW25WR680FTL; Supplier 1: LCSC; Supplier Part Number 1: C171422; JLCPCB Part Number: C171422; Power Rating: 1W; Category: Resistors; Package Size: 2512; JLCPCB Basic Part: Yes; Tolerance: ±1%; Temperature Coefficient: ±100ppm/℃; Temperature Rating: -55℃~+155℃; ComponentLink1Description: Datasheet; ComponentLink1URL: https://wmsc.lcsc.com/wmsc/upload/file/pdf/v2/lcsc/2202141730_Walsin-Tech-Corp-WW25WR680FTL_C171422.pdf; ComponentLink2Description: JLCPCB Part URL; ComponentLink2URL: https://jlcpcb.com/partdetail/C171422
pins: 1, 2
1 alternate drawing of the same symbol

## WW25XR020JTL
designator R?  Resistance: 20mΩ  (hidden comment: *)
Resistor, 20mΩ, ±5%, 1W, ±2100ppm/℃, SMD 2512; Manufacturer: Uniroyal; Manufacturer Part Number: WW25XR020JTL; Supplier 1: LCSC; Supplier Part Number 1: C171423; JLCPCB Part Number: C171423; Power Rating: 1W; Category: Resistors; Package Size: 2512; JLCPCB Basic Part: Yes; Tolerance: ±5%; Temperature Coefficient: ±2100ppm/℃; ComponentLink1Description: Datasheet; ComponentLink1URL: https://wmsc.lcsc.com/wmsc/upload/file/pdf/v2/lcsc/2202141800_Walsin-Tech-Corp-WW25XR020JTL_C171423.pdf; ComponentLink2Description: JLCPCB Part URL; ComponentLink2URL: https://jlcpcb.com/partdetail/C171423
pins: 1, 2
1 alternate drawing of the same symbol

## WW25XR120FTL
designator R?  Resistance: 120mΩ  (hidden comment: *)
Resistor, 120mΩ, ±1%, 1W, ±500ppm/℃, SMD 2512; Manufacturer: Uniroyal; Manufacturer Part Number: WW25XR120FTL; Supplier 1: LCSC; Supplier Part Number 1: C2991430; JLCPCB Part Number: C2991430; Power Rating: 1W; Category: Resistors; Package Size: 2512; JLCPCB Basic Part: Yes; Tolerance: ±1%; Temperature Coefficient: ±500ppm/℃; ComponentLink1Description: Datasheet; ComponentLink1URL: https://wmsc.lcsc.com/wmsc/upload/file/pdf/v2/lcsc/2204081830_Walsin-Tech-Corp-WW25XR120FTL_C2991430.pdf; ComponentLink2Description: JLCPCB Part URL; ComponentLink2URL: https://jlcpcb.com/partdetail/C2991430
pins: 1, 2
1 alternate drawing of the same symbol

## YLR12-2-0_5F-W
designator R?  Resistance: 0.5mΩ  (hidden comment: *)
Resistor, 0.5mΩ, ±1%, 2W, ±50ppm/℃, SMD 2512; Manufacturer: Uniroyal; Manufacturer Part Number: YLR12-2-0.5F-W; Supplier 1: LCSC; Supplier Part Number 1: C493471; JLCPCB Part Number: C493471; Power Rating: 2W; Category: Resistors; Package Size: 2512; JLCPCB Basic Part: Yes; Tolerance: ±1%; Temperature Coefficient: ±50ppm/℃; ComponentLink1Description: Datasheet; ComponentLink1URL: https://wmsc.lcsc.com/wmsc/upload/file/pdf/v2/lcsc/2310300938_Shenzhen-Yezhan-Elec--YLR12-2-0-5F-W_C493471.pdf; ComponentLink2Description: JLCPCB Part URL; ComponentLink2URL: https://jlcpcb.com/partdetail/C493471
pins: 1, 2
1 alternate drawing of the same symbol

## YLR12-2-4F-W
designator R?  Resistance: 4mΩ  (hidden comment: *)
Resistor, 4mΩ, ±1%, 2W, ±50ppm/℃, SMD 2512; Manufacturer: Uniroyal; Manufacturer Part Number: YLR12-2-4F-W; Supplier 1: LCSC; Supplier Part Number 1: C493473; JLCPCB Part Number: C493473; Power Rating: 2W; Category: Resistors; Package Size: 2512; JLCPCB Basic Part: Yes; Tolerance: ±1%; Temperature Coefficient: ±50ppm/℃; ComponentLink1Description: Datasheet; ComponentLink1URL: https://wmsc.lcsc.com/wmsc/upload/file/pdf/v2/lcsc/2310300938_Shenzhen-Yezhan-Elec--YLR12-2-4F-W_C493473.pdf; ComponentLink2Description: JLCPCB Part URL; ComponentLink2URL: https://jlcpcb.com/partdetail/C493473
pins: 1, 2
1 alternate drawing of the same symbol

## YLR12-2-7F-W
designator R?  Resistance: 7mΩ  (hidden comment: *)
Resistor, 7mΩ, ±1%, 2W, ±50ppm/℃, SMD 2512; Manufacturer: Uniroyal; Manufacturer Part Number: YLR12-2-7F-W; Supplier 1: LCSC; Supplier Part Number 1: C493472; JLCPCB Part Number: C493472; Power Rating: 2W; Category: Resistors; Package Size: 2512; JLCPCB Basic Part: Yes; Tolerance: ±1%; Temperature Coefficient: ±50ppm/℃; ComponentLink1Description: Datasheet; ComponentLink1URL: https://wmsc.lcsc.com/wmsc/upload/file/pdf/v2/lcsc/2310300938_Shenzhen-Yezhan-Elec--YLR12-2-7F-W_C493472.pdf; ComponentLink2Description: JLCPCB Part URL; ComponentLink2URL: https://jlcpcb.com/partdetail/C493472
pins: 1, 2
1 alternate drawing of the same symbol

## YLR12-2-12F-W
designator R?  Resistance: 12mΩ  (hidden comment: *)
Resistor, 12mΩ, ±1%, 2W, ±50ppm/℃, SMD 2512; Manufacturer: Uniroyal; Manufacturer Part Number: YLR12-2-12F-W; Supplier 1: LCSC; Supplier Part Number 1: C493474; JLCPCB Part Number: C493474; Power Rating: 2W; Category: Resistors; Package Size: 2512; JLCPCB Basic Part: Yes; Tolerance: ±1%; Temperature Coefficient: ±50ppm/℃; ComponentLink1Description: Datasheet; ComponentLink1URL: https://wmsc.lcsc.com/wmsc/upload/file/pdf/v2/lcsc/2310300938_Shenzhen-Yezhan-Elec--YLR12-2-12F-W_C493474.pdf; ComponentLink2Description: JLCPCB Part URL; ComponentLink2URL: https://jlcpcb.com/partdetail/C493474
pins: 1, 2
1 alternate drawing of the same symbol

## YLR12-2-15F-W
designator R?  Resistance: 15mΩ  (hidden comment: *)
Resistor, 15mΩ, ±1%, 2W, ±50ppm/℃, SMD 2512; Manufacturer: Uniroyal; Manufacturer Part Number: YLR12-2-15F-W; Supplier 1: LCSC; Supplier Part Number 1: C493475; JLCPCB Part Number: C493475; Power Rating: 2W; Category: Resistors; Package Size: 2512; JLCPCB Basic Part: Yes; Tolerance: ±1%; Temperature Coefficient: ±50ppm/℃; ComponentLink1Description: Datasheet; ComponentLink1URL: https://wmsc.lcsc.com/wmsc/upload/file/pdf/v2/lcsc/2310300938_Shenzhen-Yezhan-Elec--YLR12-2-15F-W_C493475.pdf; ComponentLink2Description: JLCPCB Part URL; ComponentLink2URL: https://jlcpcb.com/partdetail/C493475
pins: 1, 2
1 alternate drawing of the same symbol

## YLR12-2-18F-W
designator R?  Resistance: 18mΩ  (hidden comment: *)
Resistor, 18mΩ, ±1%, 2W, ±50ppm/℃, SMD 2512; Manufacturer: Uniroyal; Manufacturer Part Number: YLR12-2-18F-W; Supplier 1: LCSC; Supplier Part Number 1: C493476; JLCPCB Part Number: C493476; Power Rating: 2W; Category: Resistors; Package Size: 2512; JLCPCB Basic Part: Yes; Tolerance: ±1%; Temperature Coefficient: ±50ppm/℃; ComponentLink1Description: Datasheet; ComponentLink1URL: https://wmsc.lcsc.com/wmsc/upload/file/pdf/v2/lcsc/2310300938_Shenzhen-Yezhan-Elec--YLR12-2-18F-W_C493476.pdf; ComponentLink2Description: JLCPCB Part URL; ComponentLink2URL: https://jlcpcb.com/partdetail/C493476
pins: 1, 2
1 alternate drawing of the same symbol

## YLR12-2-25F-W
designator R?  Resistance: 25mΩ  (hidden comment: *)
Resistor, 25mΩ, ±1%, 2W, ±50ppm/℃, SMD 2512; Manufacturer: Uniroyal; Manufacturer Part Number: YLR12-2-25F-W; Supplier 1: LCSC; Supplier Part Number 1: C493477; JLCPCB Part Number: C493477; Power Rating: 2W; Category: Resistors; Package Size: 2512; JLCPCB Basic Part: Yes; Tolerance: ±1%; Temperature Coefficient: ±50ppm/℃; ComponentLink1Description: Datasheet; ComponentLink1URL: https://wmsc.lcsc.com/wmsc/upload/file/pdf/v2/lcsc/2310300938_Shenzhen-Yezhan-Elec--YLR12-2-25F-W_C493477.pdf; ComponentLink2Description: JLCPCB Part URL; ComponentLink2URL: https://jlcpcb.com/partdetail/C493477
pins: 1, 2
1 alternate drawing of the same symbol

## YLR12-2-30F-W
designator R?  Resistance: 30mΩ  (hidden comment: *)
Resistor, 30mΩ, ±1%, 2W, ±50ppm/℃, SMD 2512; Manufacturer: Uniroyal; Manufacturer Part Number: YLR12-2-30F-W; Supplier 1: LCSC; Supplier Part Number 1: C493478; JLCPCB Part Number: C493478; Power Rating: 2W; Category: Resistors; Package Size: 2512; JLCPCB Basic Part: Yes; Tolerance: ±1%; Temperature Coefficient: ±50ppm/℃; ComponentLink1Description: Datasheet; ComponentLink1URL: https://wmsc.lcsc.com/wmsc/upload/file/pdf/v2/lcsc/2310300938_Shenzhen-Yezhan-Elec--YLR12-2-30F-W_C493478.pdf; ComponentLink2Description: JLCPCB Part URL; ComponentLink2URL: https://jlcpcb.com/partdetail/C493478
pins: 1, 2
1 alternate drawing of the same symbol

## YLR12-2-45F-W
designator R?  Resistance: 45mΩ  (hidden comment: *)
Resistor, 45mΩ, ±1%, 2W, ±50ppm/℃, SMD 2512; Manufacturer: Uniroyal; Manufacturer Part Number: YLR12-2-45F-W; Supplier 1: LCSC; Supplier Part Number 1: C493480; JLCPCB Part Number: C493480; Power Rating: 2W; Category: Resistors; Package Size: 2512; JLCPCB Basic Part: Yes; Tolerance: ±1%; Temperature Coefficient: ±50ppm/℃; ComponentLink1Description: Datasheet; ComponentLink1URL: https://wmsc.lcsc.com/wmsc/upload/file/pdf/v2/lcsc/2310300938_Shenzhen-Yezhan-Elec--YLR12-2-45F-W_C493480.pdf; ComponentLink2Description: JLCPCB Part URL; ComponentLink2URL: https://jlcpcb.com/partdetail/C493480
pins: 1, 2
1 alternate drawing of the same symbol

## YLR12-2-100F
designator R?  Resistance: 100mΩ  (hidden comment: *)
Resistor, 100mΩ, ±1%, 2W, ±50ppm/℃, SMD 2512; Manufacturer: Uniroyal; Manufacturer Part Number: YLR12-2-100F; Supplier 1: LCSC; Supplier Part Number 1: C493481; JLCPCB Part Number: C493481; Power Rating: 2W; Category: Resistors; Package Size: 2512; JLCPCB Basic Part: Yes; Tolerance: ±1%; Temperature Coefficient: ±50ppm/℃; ComponentLink1Description: Datasheet; ComponentLink1URL: https://wmsc.lcsc.com/wmsc/upload/file/pdf/v2/lcsc/2310300938_Shenzhen-Yezhan-Elec--YLR12-2-100F_C493481.pdf; ComponentLink2Description: JLCPCB Part URL; ComponentLink2URL: https://jlcpcb.com/partdetail/C493481
pins: 1, 2
1 alternate drawing of the same symbol